# Altium footprint library Standard2.PcbLib: 423 footprints (part 15 of 27)
Each footprint in its own frame and in the unit in brackets; x right, y up, seen from the top. Pads: shape width x height; smd on the part's side, far side on the other; paste and mask are expansions set on the pad; w line width, h text height; cw(c..) or ccw(c..) is an arc to the next point about the centre after c.
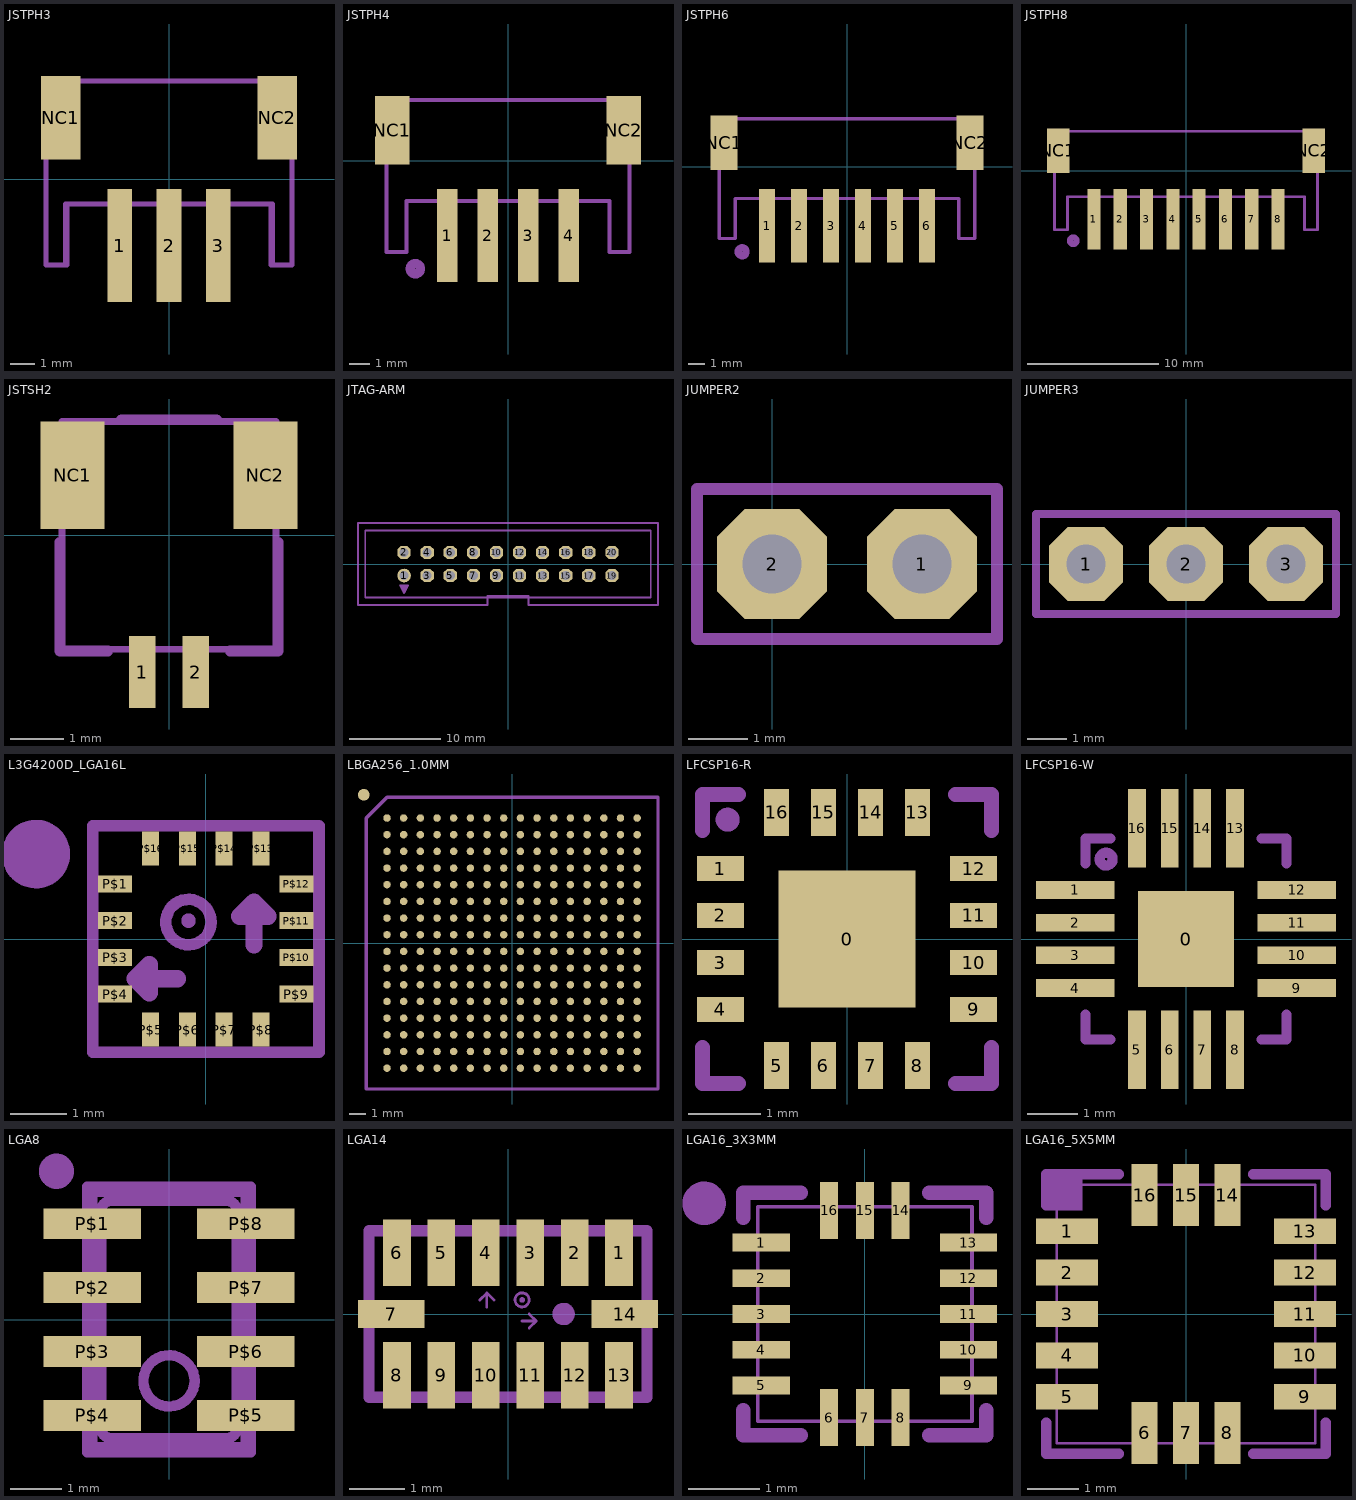
[diagram p14: the footprints below, top view; thin cyan lines are the x and y axes]

## JSTPH3 [mm]
pads (5):
  rect 1x4.6 smd: 1(-2,-2.7) 2(0,-2.7) 3(2,-2.7)
  rect 1.6x3.4 smd: NC1(-4.4,2.5) NC2(4.4,2.5)
Mechanical 2:
  lines w0.203: -5,0.5 -5,-3.5 -4.15,-3.5 -4.15,-1 -2.75,-1 ; -3.25,4 3.25,4 ; 0.75,-1 4.15,-1 4.15,-3.5 5,-3.5 5,0.5
Mechanical 18:
  lines w0.203: -5,-3.5 -5,4 5,4 5,-3.5 4.2,-3.5 4.2,-1 -4.2,-1 -4.2,-3.5 -5,-3.5

## JSTPH4 [mm]
pads (6):
  rect 1x4.6 smd: 1(-3,-3.7) 2(-1,-3.7) 3(1,-3.7) 4(3,-3.7)
  rect 1.7x3.4 smd: NC1(-5.7,1.5) NC2(5.7,1.5)
Mechanical 2:
  circle w0.445: c-4.572,-5.334 r0.254
  lines w0.203: -6,-0.5 -6,-4.5 -5,-4.5 -5,-2 -3.75,-2 ; -4.5,3 4.5,3 ; 3.75,-2 5,-2 5,-4.5 6,-4.5 6,-0.5
Mechanical 18:
  lines w0.203: -6,-4.5 -6,3 6,3 6,-4.5 5,-4.5 5,-2 -5,-2 -5,-4.5 -6,-4.5

## JSTPH6 [mm]
pads (8):
  rect 1x4.6 smd: 1(-5,-3.7) 2(-3,-3.7) 3(-1,-3.7) 4(1,-3.7) 5(3,-3.7) 6(5,-3.7)
  rect 1.7x3.4 smd: NC1(-7.7,1.5) NC2(7.7,1.5)
Mechanical 2:
  circle w0.445: c-6.572,-5.334 r0.254
  lines w0.203: -8,-0.5 -8,-4.5 -7,-4.5 -7,-2 -5.75,-2 ; -6.5,3 6.5,3 ; 1.75,-2 7,-2 7,-4.5 8,-4.5 8,-0.5
Mechanical 18:
  lines w0.203: -8,-4.5 -8,3 8,3 8,-4.5 7,-4.5 7,-2 -7,-2 -7,-4.5 -8,-4.5

## JSTPH8 [mm]
pads (10):
  rect 1x4.6 smd: 1(-7,-3.7) 2(-5,-3.7) 3(-3,-3.7) 4(-1,-3.7) 5(1,-3.7) 6(3,-3.7) 7(5,-3.7) 8(7,-3.7)
  rect 1.7x3.4 smd: NC1(-9.7,1.5) NC2(9.7,1.5)
Mechanical 2:
  circle w0.445: c-8.572,-5.334 r0.254
  lines w0.203: -10,-0.5 -10,-4.5 -9,-4.5 -9,-2 -7.75,-2 ; -8.5,3 8.5,3 ; -0.25,-2 9,-2 9,-4.5 10,-4.5 10,-0.5
Mechanical 18:
  lines w0.203: -10,-4.5 -10,3 10,3 10,-4.5 9,-4.5 9,-2 -9,-2 -9,-4.5 -10,-4.5

## JSTSH2 [mm]
pads (4):
  rect 0.5x1.35 smd: 1(-0.5,-2.55) 2(0.5,-2.55)
  rect 1.2x2 smd: NC1(-1.8,1.125) NC2(1.8,1.125)
Mechanical 1:
  lines w0.127: -2,-2.125 2,-2.125 2,2.125 -2,2.125 -2,-2.125
Mechanical 2:
  lines w0.203: -2.032,-0.127 -2.032,-2.159 -1.143,-2.159 ; -0.889,2.159 0.889,2.159 ; 1.143,-2.159 2.032,-2.159 2.032,-0.127

## JTAG-ARM [mm]
pads (20):
  round 1.5 hole 1: 1(-11.43,-1.27)
  oct 1.452x1.452 hole 1: 2(-11.43,1.27) 3(-8.89,-1.27) 4(-8.89,1.27) 5(-6.35,-1.27) 6(-6.35,1.27) 7(-3.81,-1.27) 8(-3.81,1.27) 9(-1.27,-1.27) 10(-1.27,1.27) 11(1.27,-1.27) 12(1.27,1.27) 13(3.81,-1.27) 14(3.81,1.27) 15(6.35,-1.27) 16(6.35,1.27) 17(8.89,-1.27) 18(8.89,1.27) 19(11.43,-1.27) 20(11.43,1.27)
Mechanical 2:
  rectangle: -11.684,-2.769 -11.176,-2.515
  rectangle: -11.811,-2.515 -11.43,-2.388
  rectangle: -11.43,-2.515 -11.049,-2.388
  rectangle: -11.557,-2.972 -11.303,-2.718
  lines w0.203: -11.43,-2.921 -11.43,-3.175 ; -11.43,-3.175 -10.998,-2.337 -11.862,-2.337 -11.43,-3.175 ; -16.5,-4.5 -16.5,4.5 16.5,4.5 16.5,-4.5 2.25,-4.5 2.25,-3.5 -2.25,-3.5 -2.25,-4.5 -16.5,-4.5
Mechanical 18:
  lines w0.203: -15.7,-3.7 15.7,-3.7 15.7,3.7 -15.7,3.7 -15.7,-3.7

## JUMPER2 [mm]
pads (2):
  oct 1.869x1.869 hole 1: 1(2.54,0) 2(0,0)
Mechanical 2:
  lines w0.203: -1.27,-1.27 -1.27,1.27 3.81,1.27 3.81,-1.27 -1.27,-1.27
Mechanical 18:
  region: 0.305,-0.305 0.305,0.305 -0.305,0.305 -0.305,-0.305
  region: 2.845,-0.305 2.845,0.305 2.235,0.305 2.235,-0.305

## JUMPER3 [mm]
pads (3):
  oct 1.869x1.869 hole 1: 1(-2.54,0) 2(0,0) 3(2.54,0)
Mechanical 2:
  lines w0.203: -3.81,-1.27 3.81,-1.27 3.81,1.27 -3.81,1.27 -3.81,-1.27
Mechanical 18:
  rectangle: -2.845,-0.305 -2.235,0.305
  rectangle: -0.305,-0.305 0.305,0.305
  rectangle: 2.235,-0.305 2.845,0.305

## L3G4200D_LGA16L [mm]
pads (16):
  rect 0.6x0.3 smd: P$1(-1.6,0.975) P$2(-1.6,0.325) P$3(-1.6,-0.325) P$4(-1.6,-0.975) P$9(1.6,-0.975) P$10(1.6,-0.325) P$11(1.6,0.325) P$12(1.6,0.975)
  rect 0.3x0.6 smd: P$5(-0.975,-1.6) P$6(-0.325,-1.6) P$7(0.325,-1.6) P$8(0.975,-1.6) P$13(0.975,1.6) P$14(0.325,1.6) P$15(-0.325,1.6) P$16(-0.975,1.6)
Mechanical 2:
  circle w0.61: c-3,1.5 r0.3
  lines w0.203: -2,-2 2,-2 2,2 -2,2 -2,-2
Mechanical 18:
  circle w0.203: c-0.306,0.298 r0.4
  circle w0.203: c-0.306,0.324 r0.025
  lines w0.203: -2,-2 2,-2 2,2 -2,2 -2,-2
  lines w0.305: -0.5,-0.7 -1.25,-0.7 ; 0.85,-0.1 0.85,0.65 ; -1.25,-0.7 -1,-0.95 -1,-0.45 -1.25,-0.7 ; 0.85,0.65 0.6,0.4 1.1,0.4 0.85,0.65

## LBGA256_1.0MM [mm]
pads (257):
  rrect100% 0.45x0.45 smd paste-0.225 mask-0.225: A1(-7.5,7.5) A2(-6.5,7.5) A3(-5.5,7.5) A4(-4.5,7.5) A5(-3.5,7.5) A6(-2.5,7.5) A7(-1.5,7.5) A8(-0.5,7.5) A9(0.5,7.5) A10(1.5,7.5) A11(2.5,7.5) A12(3.5,7.5) A13(4.5,7.5) A14(5.5,7.5) A15(6.5,7.5) A16(7.5,7.5) B1(-7.5,6.5) B2(-6.5,6.5) B3(-5.5,6.5) B4(-4.5,6.5) B5(-3.5,6.5) B6(-2.5,6.5) B7(-1.5,6.5) B8(-0.5,6.5) B9(0.5,6.5) B10(1.5,6.5) B11(2.5,6.5) B12(3.5,6.5) B13(4.5,6.5) B14(5.5,6.5) B15(6.5,6.5) B16(7.5,6.5) C1(-7.5,5.5) C2(-6.5,5.5) C3(-5.5,5.5) C4(-4.5,5.5) C5(-3.5,5.5) C6(-2.5,5.5) C7(-1.5,5.5) C8(-0.5,5.5) C9(0.5,5.5) C10(1.5,5.5) C11(2.5,5.5) C12(3.5,5.5) C13(4.5,5.5) C14(5.5,5.5) C15(6.5,5.5) C16(7.5,5.5) D1(-7.5,4.5) D2(-6.5,4.5) D3(-5.5,4.5) D4(-4.5,4.5) D5(-3.5,4.5) D6(-2.5,4.5) D7(-1.5,4.5) D8(-0.5,4.5) D9(0.5,4.5) D10(1.5,4.5) D11(2.5,4.5) D12(3.5,4.5) D13(4.5,4.5) D14(5.5,4.5) D15(6.5,4.5) D16(7.5,4.5) E1(-7.5,3.5) E2(-6.5,3.5) E3(-5.5,3.5) E4(-4.5,3.5) E5(-3.5,3.5) E6(-2.5,3.5) E7(-1.5,3.5) E8(-0.5,3.5) E9(0.5,3.5) E10(1.5,3.5) E11(2.5,3.5) E12(3.5,3.5) E13(4.5,3.5) E14(5.5,3.5) E15(6.5,3.5) E16(7.5,3.5) F1(-7.5,2.5) F2(-6.5,2.5) F3(-5.5,2.5) F4(-4.5,2.5) F5(-3.5,2.5) F6(-2.5,2.5) F7(-1.5,2.5) F8(-0.5,2.5) F9(0.5,2.5) F10(1.5,2.5) F11(2.5,2.5) F12(3.5,2.5) F13(4.5,2.5) F14(5.5,2.5) F15(6.5,2.5) F16(7.5,2.5) G1(-7.5,1.5) G2(-6.5,1.5) G3(-5.5,1.5) G4(-4.5,1.5) G5(-3.5,1.5) G6(-2.5,1.5) G7(-1.5,1.5) G8(-0.5,1.5) G9(0.5,1.5) G10(1.5,1.5) G11(2.5,1.5) G12(3.5,1.5) G13(4.5,1.5) G14(5.5,1.5) G15(6.5,1.5) G16(7.5,1.5) H1(-7.5,0.5) H2(-6.5,0.5) H3(-5.5,0.5) H4(-4.5,0.5) H5(-3.5,0.5) H6(-2.5,0.5) H7(-1.5,0.5) H8(-0.5,0.5) H9(0.5,0.5) H10(1.5,0.5) H11(2.5,0.5) H12(3.5,0.5) H13(4.5,0.5) H14(5.5,0.5) H15(6.5,0.5) H16(7.5,0.5) J1(-7.5,-0.5) J2(-6.5,-0.5) J3(-5.5,-0.5) J4(-4.5,-0.5) J5(-3.5,-0.5) J6(-2.5,-0.5) J7(-1.5,-0.5) J8(-0.5,-0.5) J9(0.5,-0.5) J10(1.5,-0.5) J11(2.5,-0.5) J12(3.5,-0.5) J13(4.5,-0.5) J14(5.5,-0.5) J15(6.5,-0.5) J16(7.5,-0.5) K1(-7.5,-1.5) K2(-6.5,-1.5) K3(-5.5,-1.5) K4(-4.5,-1.5) K5(-3.5,-1.5) K6(-2.5,-1.5) K7(-1.5,-1.5) K8(-0.5,-1.5) K9(0.5,-1.5) K10(1.5,-1.5) K11(2.5,-1.5) K12(3.5,-1.5) K13(4.5,-1.5) K14(5.5,-1.5) K15(6.5,-1.5) K16(7.5,-1.5) L1(-7.5,-2.5) L2(-6.5,-2.5) L3(-5.5,-2.5) L4(-4.5,-2.5) L5(-3.5,-2.5) L6(-2.5,-2.5) L7(-1.5,-2.5) L8(-0.5,-2.5) L9(0.5,-2.5) L10(1.5,-2.5) L11(2.5,-2.5) L12(3.5,-2.5) L13(4.5,-2.5) L14(5.5,-2.5) L15(6.5,-2.5) L16(7.5,-2.5) M1(-7.5,-3.5) M2(-6.5,-3.5) M3(-5.5,-3.5) M4(-4.5,-3.5) M5(-3.5,-3.5) M6(-2.5,-3.5) M7(-1.5,-3.5) M8(-0.5,-3.5) M9(0.5,-3.5) M10(1.5,-3.5) M11(2.5,-3.5) M12(3.5,-3.5) M13(4.5,-3.5) M14(5.5,-3.5) M15(6.5,-3.5) M16(7.5,-3.5) N1(-7.5,-4.5) N2(-6.5,-4.5) N3(-5.5,-4.5) N4(-4.5,-4.5) N5(-3.5,-4.5) N6(-2.5,-4.5) N7(-1.5,-4.5) N8(-0.5,-4.5) N9(0.5,-4.5) N10(1.5,-4.5) N11(2.5,-4.5) N12(3.5,-4.5) N13(4.5,-4.5) N14(5.5,-4.5) N15(6.5,-4.5) N16(7.5,-4.5) P1(-7.5,-5.5) P2(-6.5,-5.5) P3(-5.5,-5.5) P4(-4.5,-5.5) P5(-3.5,-5.5) P6(-2.5,-5.5) P7(-1.5,-5.5) P8(-0.5,-5.5) P9(0.5,-5.5) P10(1.5,-5.5) P11(2.5,-5.5) P12(3.5,-5.5) P13(4.5,-5.5) P14(5.5,-5.5) P15(6.5,-5.5) P16(7.5,-5.5) R1(-7.5,-6.5) R2(-6.5,-6.5) R3(-5.5,-6.5) R4(-4.5,-6.5) R5(-3.5,-6.5) R6(-2.5,-6.5) R7(-1.5,-6.5) R8(-0.5,-6.5) R9(0.5,-6.5) R10(1.5,-6.5) R11(2.5,-6.5) R12(3.5,-6.5) R13(4.5,-6.5) R14(5.5,-6.5) R15(6.5,-6.5) R16(7.5,-6.5) T1(-7.5,-7.5) T2(-6.5,-7.5) T3(-5.5,-7.5) T4(-4.5,-7.5) T5(-3.5,-7.5) T6(-2.5,-7.5) T7(-1.5,-7.5) T8(-0.5,-7.5) T9(0.5,-7.5) T10(1.5,-7.5) T11(2.5,-7.5) T12(3.5,-7.5) T13(4.5,-7.5) T14(5.5,-7.5) T15(6.5,-7.5) T16(7.5,-7.5)
  rrect100% 0.7x0.7 smd paste-0.35: FIDUCIAL(-8.89,8.89)
Top Solder:
  drawing of 256 lines, arcs and shapes, not listed
Mechanical 2:
  lines w0.203: -8.75,-8.75 8.75,-8.75 8.75,8.75 -7.5,8.75 -8.75,7.5 -8.75,-8.75

## LFCSP16-R [mm]
pads (17):
  rect 1.9x1.9 smd paste-0.95: 0(0,0)
  rect 0.65x0.35 smd: 1(-1.75,0.975) 2(-1.75,0.325) 3(-1.75,-0.325) 4(-1.75,-0.975) 9(1.75,-0.975) 10(1.75,-0.325) 11(1.75,0.325) 12(1.75,0.975)
  rect 0.35x0.65 smd: 5(-0.975,-1.75) 6(-0.325,-1.75) 7(0.325,-1.75) 8(0.975,-1.75) 13(0.975,1.75) 14(0.325,1.75) 15(-0.325,1.75) 16(-0.975,1.75)
Top Paste:
  rectangle: -0.25,-0.25 0.25,0.25
Mechanical 2:
  circle w0.203: c-1.651,1.651 r0.064
  lines w0.203: -2,-1.5 -2,-2 -1.5,-2 ; -2,1.5 -2,2 -1.5,2 ; 1.5,-2 2,-2 2,-1.5 ; 1.5,2 2,2 2,1.5

## LFCSP16-W [mm]
pads (17):
  rect 1.9x1.9 smd paste-0.95: 0(0,0)
  rect 1.558x0.35 smd: 1(-2.204,0.975) 2(-2.204,0.325) 3(-2.204,-0.325) 4(-2.204,-0.975) 9(2.204,-0.975) 10(2.204,-0.325) 11(2.204,0.325) 12(2.204,0.975)
  rect 0.35x1.558 smd: 5(-0.975,-2.204) 6(-0.325,-2.204) 7(0.325,-2.204) 8(0.975,-2.204) 13(0.975,2.204) 14(0.325,2.204) 15(-0.325,2.204) 16(-0.975,2.204)
Top Paste:
  rectangle: -0.975,-0.975 0.975,0.975
Top Solder:
  rectangle: -2.05,0.775 -1.3,1.175
  rectangle: -2.05,0.125 -1.3,0.525
  rectangle: -2.05,-0.525 -1.3,-0.125
  rectangle: -2.05,-1.175 -1.3,-0.775
  region: -0.775,-2.05 -0.775,-1.3 -1.175,-1.3 -1.175,-2.05
  region: -0.125,-2.05 -0.125,-1.3 -0.525,-1.3 -0.525,-2.05
  region: 0.525,-2.05 0.525,-1.3 0.125,-1.3 0.125,-2.05
  region: 1.175,-2.05 1.175,-1.3 0.775,-1.3 0.775,-2.05
  region: 2.05,-0.775 1.3,-0.775 1.3,-1.175 2.05,-1.175
  region: 2.05,-0.125 1.3,-0.125 1.3,-0.525 2.05,-0.525
  region: 2.05,0.525 1.3,0.525 1.3,0.125 2.05,0.125
  region: 2.05,1.175 1.3,1.175 1.3,0.775 2.05,0.775
  region: 0.775,2.05 0.775,1.3 1.175,1.3 1.175,2.05
  region: 0.125,2.05 0.125,1.3 0.525,1.3 0.525,2.05
  region: -0.525,2.05 -0.525,1.3 -0.125,1.3 -0.125,2.05
  region: -1.175,2.05 -1.175,1.3 -0.775,1.3 -0.775,2.05
  rectangle: -1.05,-1.05 1.05,1.05
Mechanical 2:
  circle w0.203: c-1.587,1.587 r0.127
  lines w0.203: -2,-1.5 -2,-2 -1.5,-2 ; -2,1.5 -2,2 -1.5,2 ; 1.5,-2 2,-2 2,-1.5 ; 1.5,2 2,2 2,1.5

## LGA8 [mm]
pads (8):
  rect 1.9x0.6 smd: P$1(-1.5,1.875) P$2(-1.5,0.625) P$3(-1.5,-0.625) P$4(-1.5,-1.875) P$5(1.5,-1.875) P$6(1.5,-0.625) P$7(1.5,0.625) P$8(1.5,1.875)
Mechanical 2:
  circle w0.406: c-2.2,2.9 r0.141
  lines w0.203: -1.6,-2.6 -1.6,2.6 1.6,2.6 1.6,-2.6 -1.6,-2.6
Mechanical 18:
  circle w0.203: c0,-1.2 r0.5
  lines w0.203: -1.5,-2.5 1.5,-2.5 1.5,2.5 -1.5,2.5 -1.5,-2.5 ; -1.325,-2.125 ccw(c-1.125,-2.125) -1.125,-2.325 1.125,-2.325 ccw(c1.125,-2.125) 1.325,-2.125 1.325,2.125 ccw(c1.125,2.125) 1.125,2.325 -1.125,2.325 ccw(c-1.125,2.125) -1.325,2.125 -1.325,-2.125

## LGA14 [mm]
pads (14):
  rect 0.5x1.2 smd: 1(2,1.1) 2(1.2,1.1) 3(0.4,1.1) 4(-0.4,1.1) 5(-1.2,1.1) 6(-2,1.1) 8(-2,-1.1) 9(-1.2,-1.1) 10(-0.4,-1.1) 11(0.4,-1.1) 12(1.2,-1.1) 13(2,-1.1)
  rect 1.2x0.5 smd: 7(-2.1,0) 14(2.1,0)
Mechanical 2:
  circle w0.203: c1,0 r0.1
  lines w0.203: -2.5,-1.5 -2.5,-0.7 ; -2.5,0.7 -2.5,1.5 ; 2.5,-1.5 2.5,-0.7 ; 2.5,0.7 2.5,1.5
Mechanical 18:
  circle w0.051: c0.254,0.254 r0.025
  circle w0.051: c0.254,0.254 r0.127
  lines w0.051: -0.508,0.254 -0.381,0.381 ; -0.381,0.127 -0.381,0.381 ; -0.254,0.254 -0.381,0.381 ; 0.254,-0.127 0.508,-0.127 ; 0.381,-0.254 0.508,-0.127 ; 0.381,0 0.508,-0.127
  lines w0.203: -2.5,-1.5 2.5,-1.5 2.5,1.5 -2.5,1.5 -2.5,-1.5

## LGA16_3X3MM [mil]
pads (16):
  rect 31.5x9.84 smd: 1(-57.09,39.37) 2(-57.09,19.69) 3(-57.09,0) 4(-57.09,-19.69) 5(-57.09,-39.37) 9(57.09,-39.37) 10(57.09,-19.69) 11(57.09,0) 12(57.09,19.69) 13(57.09,39.37)
  rect 9.84x31.5 smd: 6(-19.69,-57.09) 7(0,-57.09) 8(19.69,-57.09) 14(19.69,57.09) 15(0,57.09) 16(-19.69,57.09)
Mechanical 2:
  circle w16: c-88.58,61.02 r3.94
  lines w8: -66.93,-53.15 -66.93,-66.93 -35.43,-66.93 ; -66.93,53.15 -66.93,66.93 -35.43,66.93 ; 35.43,-66.93 66.93,-66.93 66.93,-53.15 ; 35.43,66.93 66.93,66.93 66.93,53.15
Mechanical 18:
  lines w2: -59.06,-59.06 59.06,-59.06 59.06,59.06 -59.06,59.06 -59.06,-59.06

## LGA16_5X5MM [mil]
pads (16):
  rect 47.24x19.69 smd: 1(-90.55,62.99) 2(-90.55,31.5) 3(-90.55,0) 4(-90.55,-31.5) 5(-90.55,-62.99) 9(90.55,-62.99) 10(90.55,-31.5) 11(90.55,0) 12(90.55,31.5) 13(90.55,62.99)
  rect 19.69x47.24 smd: 6(-31.5,-90.55) 7(0,-90.55) 8(31.5,-90.55) 14(31.5,90.55) 15(0,90.55) 16(-31.5,90.55)
Mechanical 2:
  rectangle: -106.3,78.74 -78.74,106.3
  lines w8: -106.3,-82.68 -106.3,-106.3 -51.18,-106.3 ; -106.3,82.68 -106.3,106.3 -51.18,106.3 ; 51.18,-106.3 106.3,-106.3 106.3,-82.68 ; 51.18,106.3 106.3,106.3 106.3,82.68
Mechanical 18:
  lines w2: -98.43,-98.43 98.43,-98.43 98.43,98.43 -98.43,98.43 -98.43,-98.43